# Altium footprint library MyLib.PcbLib: 575 footprints (part 22 of 36)
Each footprint in its own frame and in the unit in brackets; x right, y up, seen from the top. Pads: shape width x height; smd on the part's side, far side on the other; paste and mask are expansions set on the pad; w line width, h text height; cw(c..) or ccw(c..) is an arc to the next point about the centre after c.
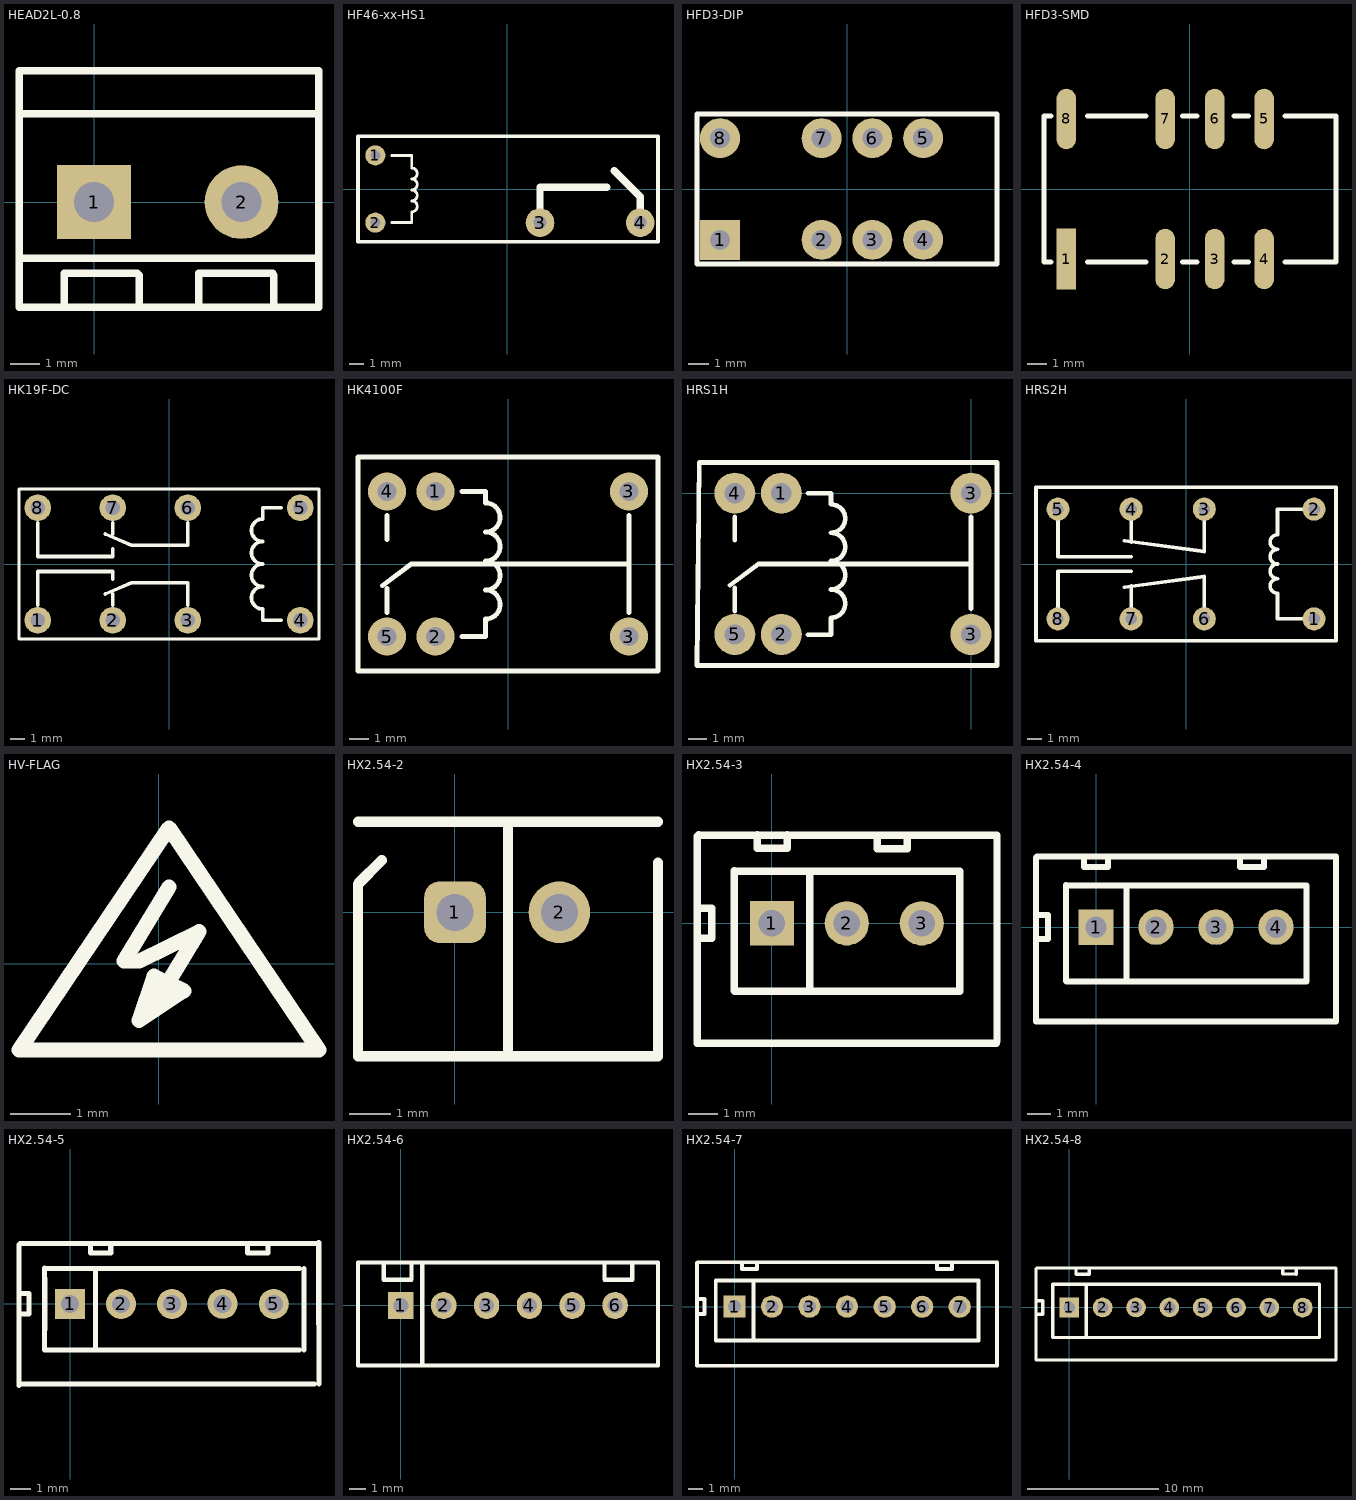
[diagram p21: the footprints below, top view; thin cyan lines are the x and y axes]

## HEAD2L-0.8 [mm]
pads (2):
  rect 2.5x2.5 hole 1.35: 1(0,0)
  round 2.5 hole 1.35: 2(5,0)
Top Overlay:
  lines w0.254: -2.54,-1.905 7.62,-1.905 ; -2.54,3 7.62,3 ; -1.016,-3.556 -1.016,-2.476 ; -1.016,-2.413 1.461,-2.413 1.524,-2.476 1.524,-3.556 ; 3.556,-3.493 3.556,-2.413 6.056,-2.413 ; 6.096,-3.556 6.096,-2.476 ; -2.54,-3.556 7.62,-3.556 7.62,4.445 -2.54,4.445 -2.54,-3.556

## HF46-xx-HS1 [mm] "一组常开，长：20.5mm，宽：7mm，高：15.3mm"
pads (4):
  round 1.4 hole 0.7: 1(-9.2,2.35) 2(-9.2,-2.35)
  round 2 hole 0.9: 3(2.3,-2.35) 4(9.3,-2.35)
Top Overlay:
  lines w0.2: -8.057,-2.35 -6.66,-2.35 -6.66,-1.59 ccw(c-6.66,-1.208) -6.66,-0.826 ccw(c-6.66,-0.444) -6.66,-0.062 ccw(c-6.66,0.32) -6.66,0.702 ccw(c-6.66,1.084) -6.66,1.466 -6.66,2.35 -8.057,2.35
  lines w0.254: -10.414,-3.683 10.541,-3.683 10.541,3.683 -10.414,3.683 -10.414,-3.683
  lines w0.508: 2.3,-2.35 2.3,0.113 2.314,0.127 6.985,0.127 ; 7.493,1.27 9.3,-0.537 9.3,-2.35
3D body "HF46-xx-HS1-.STEP": height 15.3, standoff -2.6, extent -10.25,-3.556 10.25,3.444

## HFD3-DIP [mm] "超小型型号继电器（15mm*7.5mm*9mm)"
pads (8):
  rect 2x2 hole 1: 1(-6.35,-2.54)
  round 2 hole 1: 2(-1.27,-2.54) 3(1.27,-2.54) 4(3.81,-2.54) 5(3.81,2.54) 6(1.27,2.54) 7(-1.27,2.54) 8(-6.35,2.54)
Top Overlay:
  lines w0.254: -7.5,-3.75 7.5,-3.75 7.5,3.75 -7.5,3.75 -7.5,-3.75
3D body "HFD3-DIP.STEP": height 9, standoff -3.3, extent -7.5,-3.817 7.5,3.683

## HFD3-SMD [mm] "超小型型号继电器（15mm*7.5mm*9mm)"
pads (8):
  rect 1x3.11 smd: 1(-6.35,-3.595)
  oval 1x3.11 smd: 2(-1.27,-3.595) 3(1.27,-3.595) 4(3.81,-3.595) 5(3.81,3.595) 6(1.27,3.595) 7(-1.27,3.595) 8(-6.35,3.595)
Top Overlay:
  lines w0.254: -7.125,-3.75 -7.5,-3.75 -7.5,3.75 -7.125,3.75 ; -5.25,-3.75 -2.25,-3.75 ; -5.25,3.75 -2.25,3.75 ; -0.375,-3.75 0.375,-3.75 ; -0.375,3.75 0.375,3.75 ; 2.25,-3.75 3,-3.75 ; 2.25,3.75 3,3.75 ; 4.875,-3.75 7.5,-3.75 7.5,3.75 4.875,3.75
3D body "HFD3-SMD-.STEP": height 9.5, standoff 0, extent -7.493,-4.65 7.507,4.65

## HK19F-DC [mm] "单刀双投，长：20.2mm，宽：10mm，高：12mm"
pads (8):
  round 1.8 hole 1: 1(-8.89,-3.81) 2(-3.81,-3.81) 3(1.27,-3.81) 4(8.89,-3.81) 5(8.89,3.81) 6(1.27,3.81) 7(-3.81,3.81) 8(-8.89,3.81)
Top Overlay:
  lines w0.2: -10.16,-5.08 -10.16,5.08 10.16,5.08 10.16,-5.08 -10.16,-5.08
  lines w0.254: -8.89,-2.794 -8.89,-0.508 -3.81,-0.508 -3.81,-1.016 ; -8.89,2.794 -8.89,0.508 -3.81,0.508 -3.81,1.016 ; -4.318,-2.032 -2.54,-1.27 1.27,-1.27 1.27,-2.794 ; -4.318,2.032 -2.54,1.27 1.27,1.27 1.27,2.794 ; -3.81,-2.794 -3.81,-2.032 ; -3.81,2.032 -3.81,2.794 ; 7.588,-3.81 6.35,-3.81 6.35,-3.048 cw(c6.35,-2.286) 6.35,-1.524 cw(c6.35,-0.762) 6.35,0 cw(c6.35,0.762) 6.35,1.524 cw(c6.35,2.286) 6.35,3.048 6.35,3.81 7.588,3.81
3D body "HK19F-DC-.STEP": height 11.85, standoff -3.25, extent -10.1,-5.047 10.1,4.953

## HK4100F [mm] "单刀双投"
pads (6):
  round 2 hole 1: 1(-3.81,3.81) 2(-3.81,-3.81) 3(6.35,-3.81) 3(6.35,3.81) 4(-6.35,3.81) 5(-6.35,-3.81)
Top Overlay:
  lines w0.254: -6.604,-1.143 -5.08,0 6.35,0 ; -6.35,-2.54 -6.35,-1.27 ; -6.35,1.27 -6.35,2.54 ; -2.413,-3.81 -1.175,-3.81 -1.175,-2.89 ccw(c-1.175,-2.128) -1.175,-1.366 ccw(c-1.175,-0.604) -1.175,0.158 ccw(c-1.175,0.92) -1.175,1.682 ccw(c-1.175,2.444) -1.175,3.206 -1.175,3.81 -2.413,3.81 ; 6.35,-2.54 6.35,2.54 ; -7.874,-5.613 -7.874,5.613 7.874,5.613 7.874,-5.613 -7.874,-5.613
3D body "HK4100F-.STEP": height 12.2, standoff -3.3, extent -7.747,-5.5 7.753,5.5

## HRS1H [mm] "单刀双投"
pads (6):
  round 2.2 hole 1.1: 1(-10.2,0) 2(-10.2,-7.6) 3(0,-7.6) 3(0,0) 4(-12.7,0) 5(-12.7,-7.6)
Top Overlay:
  lines w0.254: -12.954,-4.953 -11.43,-3.81 0,-3.81 ; -12.7,-6.35 -12.7,-5.08 ; -12.7,-2.54 -12.7,-1.27 ; -8.763,-7.62 -7.525,-7.62 -7.525,-6.7 ccw(c-7.525,-5.938) -7.525,-5.176 ccw(c-7.525,-4.414) -7.525,-3.652 ccw(c-7.525,-2.89) -7.525,-2.128 ccw(c-7.525,-1.366) -7.525,-0.604 -7.525,0 -8.763,0 ; 0,-6.223 0,-1.27 ; -14.732,-9.271 1.397,-9.271 1.397,1.651 -14.605,1.651 -14.732,-9.271
3D body "HRS1H-.STEP": height 11.8, standoff -3.3, extent -14.351,-8.933 1.149,1.567

## HRS2H [mm] "双刀双投"
pads (8):
  round 1.6 hole 0.8: 1(8.89,-3.81) 2(8.89,3.81) 3(1.27,3.81) 4(-3.81,3.81) 5(-8.89,3.81) 6(1.27,-3.81) 7(-3.81,-3.81) 8(-8.89,-3.81)
Top Overlay:
  lines w0.254: -8.89,-3.81 -8.89,-0.508 -3.81,-0.508 ; -8.89,3.81 -8.89,0.508 -3.81,0.508 ; -4.27,-1.621 1.27,-0.866 1.27,-1.27 1.27,-3.81 ; -4.27,1.621 1.27,0.866 1.27,1.27 1.27,3.81 ; -3.81,-3.81 -3.81,-1.524 ; -3.81,1.524 -3.81,3.81 ; 8.89,-3.81 6.35,-3.81 6.35,-2.032 cw(c6.35,-1.524) 6.35,-1.016 cw(c6.35,-0.508) 6.35,0 cw(c6.35,0.508) 6.35,1.016 cw(c6.35,1.524) 6.35,2.032 6.35,3.81 8.89,3.81 ; -10.414,-5.334 -10.414,5.334 10.414,5.334 10.414,-5.334 -10.414,-5.334
3D body "HRS2H-.STEP": height 10.91, standoff -4, extent -10.033,-4.95 10.167,4.95

## HV-FLAG [mm]
Top Overlay:
  lines w0.249: -0.079,-0.697 0.667,0.533 -0.328,0.041 -0.577,0.041 0.17,1.271 ; -2.318,-1.435 0.17,2.254 2.657,-1.435 -2.318,-1.435 ; -0.328,-0.943 -0.079,-0.205 0.418,-0.451 -0.328,-0.943

## HX2.54-2 [mm] "两针白色插座（已加焊）"
pads (2):
  rrect50% 1.5x1.5 hole 0.9: 1(0,0)
  round 1.5 hole 0.9: 2(2.54,0)
Top Overlay:
  lines w0.254: -2.36,2.2 4.94,2.2 ; -1.778,1.27 -2.36,0.688 -2.36,0.635 -2.36,-3.5 4.94,-3.5 4.94,1.206 ; 1.29,-3.5 1.29,2.2
3D body "SIP2_Y.stp": height 7, standoff -3, extent -2.48,-3.55 5.02,2.45

## HX2.54-3 [mm]
pads (3):
  rect 1.5x1.5 hole 0.9: 1(0,0)
  round 1.5 hole 0.9: 2(2.54,0) 3(5.08,0)
Top Overlay:
  lines w0.254: -2.54,-0.508 -2.032,-0.508 -2.032,0.508 -2.54,0.508 ; -2.536,2.54 -2.536,2.95 ; -2.496,2.995 7.633,2.995 7.633,-4.005 ; -1.27,-2.286 -1.27,1.778 ; -1.257,-2.296 6.363,-2.296 ; -1.257,1.768 6.375,1.768 ; -0.504,2.998 -0.504,2.538 0.512,2.538 0.512,2.998 ; 1.283,-2.296 1.283,1.768 ; 3.573,2.995 3.573,2.535 4.589,2.535 4.589,2.995 ; 6.375,-2.299 6.375,1.765 ; 7.607,-4.061 -2.536,-4.061 -2.536,2.95 ; -2.536,2.95 -2.488,2.998 -2.536,2.95
3D body "hx254-3tl_y.stp": height 7, standoff -3, extent -2.409,-3.581 7.591,2.419

## HX2.54-4 [mm]
pads (4):
  rect 1.5x1.5 hole 0.9: 1(0,0)
  round 1.5 hole 0.9: 2(2.54,0) 3(5.08,0) 4(7.62,0)
Top Overlay:
  lines w0.254: -2.54,-0.508 -2.032,-0.508 -2.032,0.508 -2.54,0.508 ; -2.536,-4.002 -2.536,2.95 ; -2.472,-4.002 -2.092,-4.002 10.16,-4.002 10.16,2.998 -2.488,2.998 ; -1.27,-2.286 -1.27,1.778 ; -1.257,-2.296 8.903,-2.296 8.903,1.768 -1.257,1.768 ; -0.504,2.998 -0.504,2.538 0.512,2.538 0.512,2.998 ; 1.283,-2.296 1.283,1.768 ; 6.1,2.998 6.1,2.538 7.116,2.538 7.116,2.998 ; -2.536,2.95 -2.488,2.998 ; -2.536,2.95 -2.488,2.998
3D body "hx254-4tl_y.stp": height 7, standoff -3, extent -2.399,-3.562 10.121,2.438

## HX2.54-5 [mm]
pads (5):
  rect 1.5x1.5 hole 0.9: 1(0,0)
  round 1.5 hole 0.9: 2(2.54,0) 3(5.08,0) 4(7.607,0.006) 5(10.16,0)
Top Overlay:
  lines w0.254: -2.553,-0.502 -2.045,-0.502 -2.045,0.514 -2.553,0.514 ; -2.491,-3.996 12.179,-3.996 ; -2.104,-3.996 -2.484,-3.996 -2.548,-4.06 -2.548,-2.028 -2.548,2.956 -2.5,3.004 12.416,3.014 ; -1.283,-2.28 -1.283,1.784 ; -1.27,-2.29 11.43,-2.29 ; -1.27,-1.27 -1.27,1.27 ; -1.27,1.774 11.43,1.774 ; 1.008,3.004 1.008,2.544 2.024,2.544 2.024,3.004 ; 1.27,-2.29 1.27,1.774 ; 1.27,-1.27 1.27,1.27 ; 8.856,3.004 8.856,2.544 9.872,2.544 9.872,3.004 ; 11.659,-2.29 11.659,1.774 ; 12.403,-1.01 12.403,3.054 ; 12.408,-3.996 12.408,0.004
3D body "hx254-5tl_y.stp": height 7.51, standoff -2.49, extent -2.562,-3.562 12.518,2.438

## HX2.54-6 [mm]
pads (6):
  rect 1.5x1.6 hole 0.9: 1(0,0)
  oval 1.5x1.6 hole 0.9: 2(2.54,0) 3(5.08,0) 4(7.62,0) 5(10.16,0) 6(12.7,0)
Top Overlay:
  lines w0.254: -1.016,2.54 -1.016,1.524 0.635,1.524 0.635,2.54 ; 1.27,-3.556 1.27,2.54 ; 12.065,2.54 12.065,1.524 13.716,1.524 13.716,2.54 ; -2.54,-3.556 15.24,-3.556 15.24,2.54 -2.54,2.54 -2.54,-3.556
3D body: height 6.1, standoff -2, extent -2.54,-3.632 15.24,2.362

## HX2.54-7 [mm]
pads (7):
  rect 1.5x1.5 hole 0.9: 1(0,0)
  round 1.5 hole 0.9: 2(2.54,0) 3(5.08,0) 4(7.62,0) 5(10.173,-0.01) 6(12.713,-0.01) 7(15.253,-0.01)
Top Overlay:
  lines w0.254: -2.54,-0.508 -2.032,-0.508 -2.032,0.508 -2.54,0.508 ; -1.257,-2.296 16.523,-2.296 16.523,1.768 -1.257,1.768 ; 0.512,2.998 0.512,2.538 1.528,2.538 1.528,2.998 ; 1.283,-2.296 1.283,1.768 ; 9.398,-2.286 -1.27,-2.286 -1.27,1.778 9.398,1.778 ; 13.72,2.998 13.72,2.538 14.736,2.538 14.736,2.998 ; 17.776,-4.002 17.776,2.998 ; 17.78,-4.002 -2.536,-4.002 -2.536,2.95 -2.488,2.998 17.78,2.998
3D body "HDR2.54x7.STEP": height 6.1, standoff -2, extent -2.535,-3.632 17.776,2.362

## HX2.54-8 [mm]
pads (8):
  rect 1.5x1.5 hole 0.9: 1(0,0)
  round 1.5 hole 0.9: 2(2.54,0) 3(5.08,0) 4(7.62,0) 5(10.16,-0.01) 6(12.7,-0.01) 7(15.24,-0.01) 8(17.78,-0.01)
Top Overlay:
  lines w0.254: -2.54,-0.508 -2.032,-0.508 -2.032,0.508 -2.54,0.508 ; 0.512,2.998 0.512,2.538 1.528,2.538 1.528,2.998 ; 1.283,-2.296 1.283,1.768 ; 16.256,3 16.256,2.54 17.272,2.54 ; 17.276,2.538 17.276,2.998 ; 19.063,-2.296 19.063,1.768 ; 19.063,-2.286 -1.27,-2.286 -1.27,1.778 19.063,1.778 ; -2.536,-4.002 -2.536,2.95 -2.488,2.998 20.316,2.998 20.316,-4.002 -2.536,-4.002
3D body "HDR2.54x8.STEP": height 6.1, standoff -2, extent -2.54,-3.632 20.32,2.362